# Altium footprint library Hydra_Ref_pcb.PcbLib: 353 footprints (part 9 of 23)
Each footprint in its own frame and in the unit in brackets; x right, y up, seen from the top. Pads: shape width x height; smd on the part's side, far side on the other; paste and mask are expansions set on the pad; w line width, h text height; cw(c..) or ccw(c..) is an arc to the next point about the centre after c.
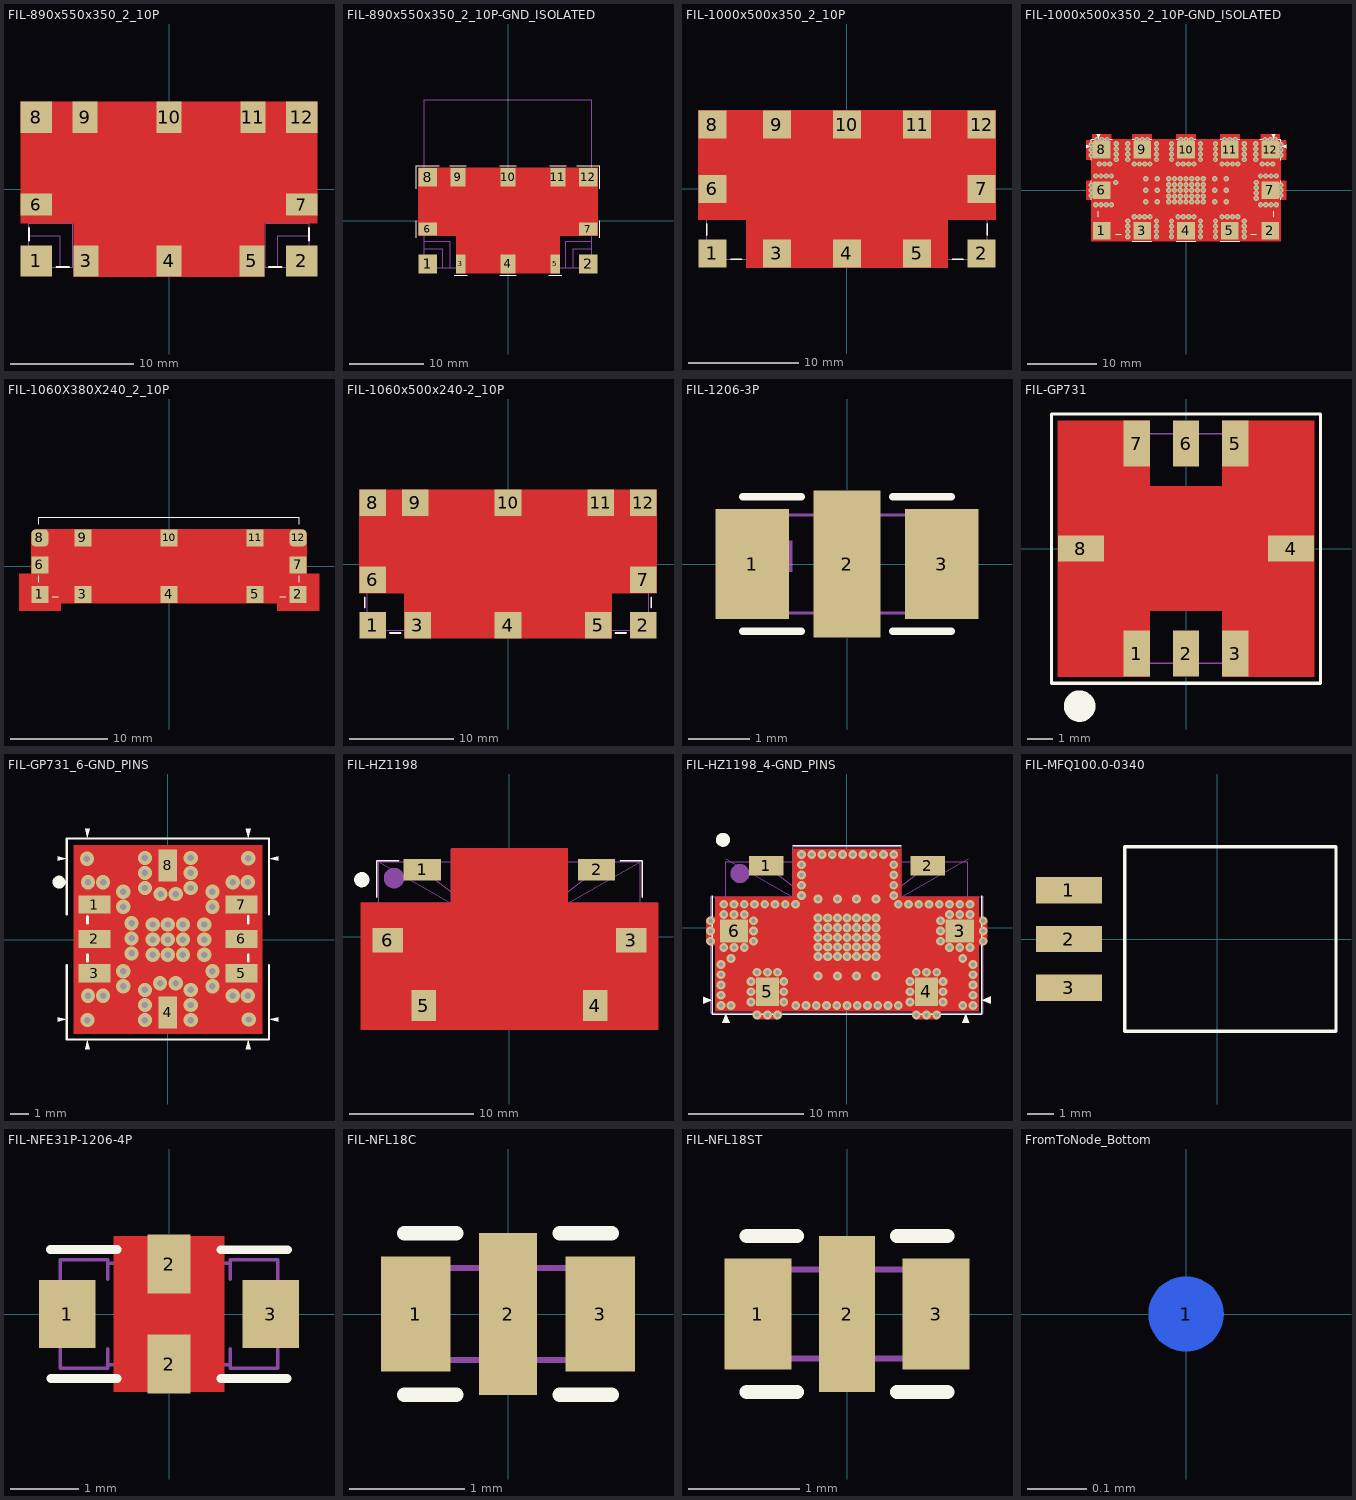
[diagram p8: the footprints below, top view; thin cyan lines are the x and y axes]

## FIL-890x550x350_2_10P [mil]
height 279.92
pads (12):
  rect 100x100 smd: 1(-425,-230) 2(425,-230) 8(-425,230) 12(425,230)
  rect 80x100 smd: 3(-265,-230) 4(0,-230) 5(265,-230) 9(-268.5,230) 10(0,230) 11(268.5,230)
  rect 100x70 smd: 6(-425,-50) 7(425,-50)
Top Layer:
  region: -475,-110 -305,-110 -305,-280 305,-280 305,-110 475,-110 475,280 -475,280
Top Overlay:
  lines w6: -448.5,-165 -448.5,-125 ; -360,-250 -320,-250 ; 320,-250 360,-250 ; 448.5,-165 448.5,-125
Top Paste:
  region: -475,-80 -275,-80 -275,-280 275,-280 275,-80 475,-80 475,280 -475,280
Top Solder:
  region: -480,-115 -310,-115 -310,-285 310,-285 310,-115 480,-115 480,285 -480,285
9 Top Assy:
  lines w2: -448.5,-219 cw(c-448.5,-250) -417.5,-250 ; -448.5,-150 -348.5,-150 -348.5,-250 ; -448.5,-110 -308.5,-110 -308.5,-250 ; -448.5,-81 ccw(c-448.5,-50) -448.5,-19 ; -448.5,-50 -435,-50 ; -448.5,219 ccw(c-448.5,250) -417.5,250 ; -299.5,-250 cw(c-268.5,-250) -237.5,-250 ; -299.5,250 ccw(c-268.5,250) -237.5,250 ; -268.5,-250 -268.5,-240 ; -268.5,240 -268.5,250 ; -31.1,-250 cw(c-0.1,-250) 30.9,-250 ; -30.9,250 ccw(c0.1,250) 31.1,250 ; 0,-250 0,-240 ; 237.5,-250 cw(c268.5,-250) 299.5,-250 ; 237.5,250 ccw(c268.5,250) 299.5,250 ; 268.5,-250 268.5,-240 ; 268.5,240 268.5,250 ; 308.5,-250 308.5,-110 448.5,-110 ; 348.5,-250 348.5,-150 448.5,-150 ; 417.5,-250 cw(c448.5,-250) 448.5,-219 ; 417.5,250 ccw(c448.5,250) 448.5,219 ; 435,-50 448.5,-50 ; 448.5,-81 cw(c448.5,-50) 448.5,-19 ; -5,240 -5,250 -5,240 ; -5,240 5,240 ; -5,240 5,240 ; 5,240 5,250 5,240 ; -448.5,-250 -448.5,250 448.5,250 448.5,-250 -448.5,-250
  text ".Designator" at -260,0 h80
3D body: height 350, standoff 0, extent -505,-300 500,310

## FIL-890x550x350_2_10P-GND_ISOLATED [mil] "All pins isolated with solder mask"
height 280
pads (12):
  rect 100x100 smd: 1(-425,-230) 2(425,-230) 8(-425,230) 12(425,230)
  rect 50x100 smd: 3(-250,-230) 5(250,-230)
  rect 80x100 smd: 4(0,-230) 9(-265,230) 10(0,230) 11(265,230)
  rect 100x70 smd: 6(-425,-45) 7(425,-45)
Top Layer:
  region: -475,-80 -275,-80 -275,-280 275,-280 275,-80 475,-80 475,280 -475,280
Top Overlay:
  lines w5: -485,-90 -485,0 ; -485,170 -485,290 -365,290 ; -310,290 -220,290 ; -285,-290 -215,-290 ; -45,-290 45,-290 ; -45,290 45,290 ; 215,-290 285,-290 ; 220,290 310,290 ; 365,290 485,290 485,170 ; 485,-90 485,0
Top Solder:
  region: 500,-295 -500,-295 -500,-305 500,-305
  region: 490,300 490,-300 500,-300 500,300
  region: 355,-95 355,-300 500,-300 500,-95
  rectangle: 290,-295 360,-150
  rectangle: -360,-300 -290,-155
  rectangle: -360,165 -320,300
  region: 500,305 -500,305 -500,295 500,295
  rectangle: 320,160 360,295
  region: -500,305 -500,-295 -490,-295 -490,305
  region: -490,-95 -490,-300 -345,-300 -345,-95
  rectangle: -210,-300 -55,-155
  rectangle: 55,-300 210,-155
  rectangle: -210,150 -55,295
  rectangle: 55,160 210,305
  region: -500,5 -360,5 -360,-165 360,-165 360,5 495,5 495,165 -500,165
9 Top Assy:
  lines w2: -445,-150 -345,-150 -345,-250 ; -445,-110 -305,-110 -305,-250 ; -445,-55 -435,-55 -435,-45 -445,-45 ; -445,240 -435,240 -435,250 435,250 435,240 445,240 ; -270,-250 -270,-240 -260,-240 -260,-250 ; -270,250 -270,240 -260,240 -260,250 ; -5,-250 -5,-240 5,-240 5,-250 ; 260,-250 260,-240 270,-240 270,-250 ; 260,250 260,240 270,240 270,250 ; 305,-250 305,-110 445,-110 ; 345,-250 345,-150 445,-150 ; 445,-55 435,-55 435,-45 445,-45 ; -5,240 -5,250 -5,240 ; -5,240 5,240 ; -5,240 5,240 ; 5,240 5,250 5,240 ; -445,-240 -435,-250 435,-250 445,-240 445,640 -445,640 -445,-240
  text ".Designator" at -140,-40 h80
3D body: height 280, standoff 0, extent -500,-305 500,305
3D body: height 280, standoff 60, extent -460,300 455,655

## FIL-1000x500x350_2_10P [mil]
height 350
pads (12):
  rect 100x100 smd: 1(-480,-230) 2(480,-230) 3(-250,-230) 4(0,-230) 5(250,-230) 6(-480,0) 7(480,0) 8(-480,230) 9(-250,230) 10(0,230) 11(250,230) 12(480,230)
Top Layer:
  region: -530,-110 -360,-110 -360,-280 360,-280 360,-110 530,-110 530,280 -530,280
Top Overlay:
  lines w6: -500,-165 -500,-125 ; -415,-250 -375,-250 ; 375,-250 415,-250 ; 500,-165 500,-125
Top Paste:
  region: -530,-110 -360,-110 -360,-280 360,-280 360,-110 530,-110 530,280 -530,280
Top Solder:
  region: -535,-115 -365,-115 -365,-285 365,-285 365,-115 535,-115 535,285 -535,285
9 Top Assy:
  lines w2: -500.03,219.02 ccw(c-499,250) -468,250 ; -500,-218 cw(c-500,-249) -469.02,-250.03 ; -500,-32 ccw(c-500,-1) -500,30 ; -282,-250 cw(c-251,-250) -220,-250 ; -280,250 ccw(c-249,250) -218,250 ; -32,-250 cw(c-1,-250) 30,-250 ; -30,250 ccw(c1,250) 32,250 ; 218,-250 cw(c249,-250) 280,-250 ; 220,250 ccw(c251,250) 282,250 ; 468,-250 cw(c499,-250) 500.03,-219.02 ; 469.02,250.03 ccw(c500,249) 500,218 ; 500,-32 cw(c500,-1) 500,30 ; -500,-250 500,-250 500,250 -500,250 -500,-250
  text ".Designator" at -330,-30 h80
3D body: height 350, standoff 0, extent -500,-250 500,250

## FIL-1000x500x350_2_10P-GND_ISOLATED [mil] "All pins isolated with solder mask"
height 350
pads (12):
  rect 100x100 smd: 1(-480,-230) 2(480,-230) 3(-250,-230) 4(0,-230) 5(250,-230) 6(-480,0) 7(480,0) 8(-480,230) 9(-250,230) 10(0,230) 11(250,230) 12(480,230)
via 510,290 diameter 30 hole 14
via 480,290 diameter 30 hole 14
via 450,290 diameter 30 hole 14
via 280,290 diameter 30 hole 14
via 250,290 diameter 30 hole 14
via 220,290 diameter 30 hole 14
via 30,290 diameter 30 hole 14
via 0,290 diameter 30 hole 14
via -30,290 diameter 30 hole 14
via -220,290 diameter 30 hole 14
via -250,290 diameter 30 hole 14
via -280,290 diameter 30 hole 14
via -450,290 diameter 30 hole 14
via -480,290 diameter 30 hole 14
via -510,290 diameter 30 hole 14
via 540,200 diameter 30 hole 14
via 540,230 diameter 30 hole 14
via 540,260 diameter 30 hole 14
via 540,-30 diameter 30 hole 14
via 540,0 diameter 30 hole 14
via 540,30 diameter 30 hole 14
via -540,260 diameter 30 hole 14
via -540,230 diameter 30 hole 14
via -540,200 diameter 30 hole 14
via 229.6,-65.6 diameter 31 hole 14
via 229.6,65.6 diameter 31 hole 14
via 229.6,0 diameter 31 hole 14
via 164,-65.6 diameter 31 hole 14
via 164,65.6 diameter 31 hole 14
via 164,0 diameter 31 hole 14
via -229.6,65.6 diameter 31 hole 14
via -229.6,-65.6 diameter 31 hole 14
via -229.6,0 diameter 31 hole 14
via -164,65.6 diameter 31 hole 14
via -164,-65.6 diameter 31 hole 14
via -164,0 diameter 31 hole 14
via -332,175 diameter 30 hole 14
via -332,205 diameter 30 hole 14
via -332,235 diameter 30 hole 14
via -332,265 diameter 30 hole 14
via -168,265 diameter 30 hole 14
via -168,235 diameter 30 hole 14
via -168,205 diameter 30 hole 14
via -168,175 diameter 30 hole 14
via -398,265 diameter 30 hole 14
via -398,235 diameter 30 hole 14
via -398,205 diameter 30 hole 14
via -398,175 diameter 30 hole 14
via 398,265 diameter 30 hole 14
via 398,235 diameter 30 hole 14
via 398,205 diameter 30 hole 14
via 398,175 diameter 30 hole 14
via 82,175 diameter 30 hole 14
via 82,205 diameter 30 hole 14
via 82,235 diameter 30 hole 14
via 82,265 diameter 30 hole 14
via -82,265 diameter 30 hole 14
via -82,235 diameter 30 hole 14
via -82,205 diameter 30 hole 14
via -82,175 diameter 30 hole 14
via 332,175 diameter 30 hole 14
via 332,205 diameter 30 hole 14
via 332,235 diameter 30 hole 14
via 332,265 diameter 30 hole 14
via 168,265 diameter 30 hole 14
via 168,235 diameter 30 hole 14
via 168,205 diameter 30 hole 14
via 168,175 diameter 30 hole 14
via 425,-82 diameter 30 hole 14
via 455,-82 diameter 30 hole 14
via 485,-82 diameter 30 hole 14
via 515,-82 diameter 30 hole 14
via 515,82 diameter 30 hole 14
via 485,82 diameter 30 hole 14
via 455,82 diameter 30 hole 14
via 425,82 diameter 30 hole 14
via 168,-175 diameter 30 hole 14
via 168,-205 diameter 30 hole 14
via 168,-235 diameter 30 hole 14
via 168,-265 diameter 30 hole 14
via 332,-265 diameter 30 hole 14
via 332,-235 diameter 30 hole 14
via 332,-205 diameter 30 hole 14
via 332,-175 diameter 30 hole 14
via -82,-175 diameter 30 hole 14
via -82,-205 diameter 30 hole 14
via -82,-235 diameter 30 hole 14
via -82,-265 diameter 30 hole 14
via 82,-265 diameter 30 hole 14
via 82,-235 diameter 30 hole 14
via 82,-205 diameter 30 hole 14
via 82,-175 diameter 30 hole 14
via -332,-175 diameter 30 hole 14
via -332,-205 diameter 30 hole 14
via -332,-235 diameter 30 hole 14
via -332,-265 diameter 30 hole 14
via -168,-265 diameter 30 hole 14
via -168,-235 diameter 30 hole 14
via -168,-205 diameter 30 hole 14
via -168,-175 diameter 30 hole 14
via -425,82 diameter 30 hole 14
via -455,82 diameter 30 hole 14
via -485,82 diameter 30 hole 14
via -515,82 diameter 30 hole 14
via -515,-82 diameter 30 hole 14
via -485,-82 diameter 30 hole 14
via -455,-82 diameter 30 hole 14
via -425,-82 diameter 30 hole 14
via -205,150 diameter 30 hole 14
via -235,150 diameter 30 hole 14
via -265,150 diameter 30 hole 14
via -295,150 diameter 30 hole 14
via -45,150 diameter 30 hole 14
via -15,150 diameter 30 hole 14
via 15,150 diameter 30 hole 14
via 45,150 diameter 30 hole 14
via 205,150 diameter 30 hole 14
via 235,150 diameter 30 hole 14
via 265,150 diameter 30 hole 14
via 295,150 diameter 30 hole 14
via 435,150 diameter 30 hole 14
via 465,150 diameter 30 hole 14
via 495,150 diameter 30 hole 14
via 400,45 diameter 30 hole 14
via 400,15 diameter 30 hole 14
via 400,-15 diameter 30 hole 14
via 400,-45 diameter 30 hole 14
via 295,-150 diameter 30 hole 14
via 265,-150 diameter 30 hole 14
via 235,-150 diameter 30 hole 14
via 205,-150 diameter 30 hole 14
via 45,-150 diameter 30 hole 14
via 15,-150 diameter 30 hole 14
via -15,-150 diameter 30 hole 14
via -45,-150 diameter 30 hole 14
via -205,-150 diameter 30 hole 14
via -235,-150 diameter 30 hole 14
via -265,-150 diameter 30 hole 14
via -295,-150 diameter 30 hole 14
via -540,-30 diameter 30 hole 14
via -540,0 diameter 30 hole 14
via -540,30 diameter 30 hole 14
via -400,45 diameter 30 hole 14
via -495,150 diameter 30 hole 14
via -465,150 diameter 30 hole 14
via -435,150 diameter 30 hole 14
via 98.4,65.6 diameter 31 hole 14
via 98.4,32.8 diameter 31 hole 14
via 98.4,0 diameter 31 hole 14
via 98.4,-32.8 diameter 31 hole 14
via 98.4,-65.6 diameter 31 hole 14
via 65.6,65.6 diameter 31 hole 14
via 65.6,32.8 diameter 31 hole 14
via 65.6,0 diameter 31 hole 14
via 65.6,-32.8 diameter 31 hole 14
via 65.6,-65.6 diameter 31 hole 14
via -65.6,-65.6 diameter 31 hole 14
via -32.8,-65.6 diameter 31 hole 14
via 0,-65.6 diameter 31 hole 14
via 32.8,-65.6 diameter 31 hole 14
via -65.6,-32.8 diameter 31 hole 14
via -32.8,-32.8 diameter 31 hole 14
via 0,-32.8 diameter 31 hole 14
via 32.8,-32.8 diameter 31 hole 14
via -65.6,0 diameter 31 hole 14
via -32.8,0 diameter 31 hole 14
via 0,0 diameter 31 hole 14
via 32.8,0 diameter 31 hole 14
via -65.6,32.8 diameter 31 hole 14
via -32.8,32.8 diameter 31 hole 14
via 0,32.8 diameter 31 hole 14
via 32.8,32.8 diameter 31 hole 14
via -98.4,32.8 diameter 31 hole 14
via -98.4,0 diameter 31 hole 14
via -98.4,-32.8 diameter 31 hole 14
via -98.4,-65.6 diameter 31 hole 14
via 32.8,65.6 diameter 31 hole 14
via 0,65.6 diameter 31 hole 14
via -32.8,65.6 diameter 31 hole 14
via -65.6,65.6 diameter 31 hole 14
via -98.4,65.6 diameter 31 hole 14
Top Layer:
  region: 435,290 435,230 525,230 525,290
  region: 450,305 450,230 510,230 510,305
  region: 205,290 205,230 295,230 295,290
  region: 220,305 220,230 280,230 280,305
  region: -45,290 -45,230 45,230 45,290
  region: -30,305 -30,230 30,230 30,305
  region: -295,290 -295,230 -205,230 -205,290
  region: -280,305 -280,230 -220,230 -220,305
  region: -525,290 -525,230 -435,230 -435,290
  region: -510,305 -510,230 -450,230 -450,305
  region: 540,275 480,275 480,185 540,185
  region: 555,260 480,260 480,200 555,200
  region: 540,45 480,45 480,-45 540,-45
  region: 555,30 480,30 480,-30 555,-30
  rectangle: -540,185 -480,275
  rectangle: -555,200 -480,260
  rectangle: -555,-30 -480,30
  rectangle: -540,-45 -480,45
  pour cut-out: 535,290 535,320 425,320 425,290
  pour cut-out: 305,290 305,320 195,320 195,290
  pour cut-out: 55,290 55,320 -55,320 -55,290
  pour cut-out: -195,290 -195,320 -305,320 -305,290
  pour cut-out: -425,290 -425,320 -535,320 -535,290
  pour cut-out: 540,175 570,175 570,285 540,285
  pour cut-out: 540,-55 570,-55 570,55 540,55
  pour cut-out: -540,285 -570,285 -570,175 -540,175
  pour cut-out: -540,55 -570,55 -570,-55 -540,-55
  region: -530,-110 -360,-110 -360,-280 360,-280 360,-110 530,-110 530,280 -530,280
  pour cut-out: -540,290 540,290 540,-290 -540,-290
Top Overlay:
  region: 490,320 500,290 510,320
  region: 570,260 540,250 570,240
  region: -570,240 -540,250 -570,260
  region: -510,320 -500,290 -490,320
  lines w5: -540,-55 -540,55 ; -540,170 -540,290 -420,290 ; -540,175 -540,285 ; -535,290 -425,290 ; -500,-150 -500,-120 ; -400,-250 -370,-250 ; -305,-290 -195,-290 ; -55,-290 55,-290 ; 195,-290 305,-290 ; 370,-250 400,-250 ; 420,290 540,290 540,170 ; 425,290 535,290 ; 500,-150 500,-120 ; 540,175 540,285 ; -305,290 -195,290 -305,290 ; -55,290 55,290 -55,290 ; 195,290 305,290 195,290 ; 540,-55 540,55 540,-55
Top Solder:
  region: 555,-295 -500,-295 -500,-305 555,-305
  region: 545,305 545,-305 555,-305 555,305
  region: 555,305 -555,305 -555,295 555,295
  region: -555,-65 -555,-305 -315,-305 -315,-65
  region: 315,-65 315,-295 555,-295 555,-65
  region: -555,305 -555,-305 -545,-305 -545,305
  region: -185,-155 -185,-305 -65,-305 -65,-155
  region: 65,-150 65,-300 185,-300 185,-150
  region: -185,300 -185,150 -65,150 -65,300
  region: 65,305 65,155 185,155 185,305
  region: 315,300 315,150 415,150 415,300
  region: -415,295 -415,145 -315,145 -315,295
  region: -555,65 -415,65 -415,-165 415,-165 415,65 550,65 550,165 -555,165
9 Top Assy:
  lines w2: -500,-219 cw(c-500,-250) -469,-250 ; -500,-31 ccw(c-500,0) -500,31 ; -500,219 ccw(c-500,250) -469,250 ; -281,-250 cw(c-250,-250) -219,-250 ; -281,250 ccw(c-250,250) -219,250 ; -31,-250 cw(c0,-250) 31,-250 ; -31,250 ccw(c0,250) 31,250 ; 219,-250 cw(c250,-250) 281,-250 ; 219,245 ccw(c250,245) 281,245 ; 469,-250 cw(c500,-250) 500,-219 ; 469,250 ccw(c500,250) 500,219 ; 500,-31 cw(c500,0) 500,31 ; -500,-250 -500,250 500,250 500,-250 -500,-250
  text ".Designator" at -135,-35 h80
3D body: height 350, standoff 0, extent -550,-300 550,300

## FIL-1060X380X240_2_10P [mil] "Lark part # 4SD3600-U200-6CC"
height 240
pads (12):
  rect 70x70 smd: 1(-525,-115) 2(525,-115) 3(-350,-115) 4(0,-115) 5(350,-115) 6(-525,5) 7(525,5) 9(-350,115) 10(0,115) 11(350,115)
  rrect50% 70x70 smd: 8(-525,115) 12(525,115)
Top Layer:
  pour cut-out: 610,-30 440,-30 440,-181 610,-181
  pour cut-out: -610,-30 -440,-30 -440,-181 -610,-181
  region: -560,-30 -440,-30 -440,-150 440,-150 440,-30 560,-30 560,134 541,150 -542,150 -560,133
Top Overlay:
  lines w5: -530,-65 -530,-40 ; -530,170 -530,198.5 530,198.5 530,170 ; -475,-125 -450,-125 ; 450,-125 475,-125 ; 530,-65 530,-40
Top Paste:
  region: -560,150 560,150 560,-30 440,-30 440,-150 -440,-150 -440,-30 -560,-30
Top Solder:
  region: 568,-81 440,-81 440,-181 568,-181
  rectangle: -568,-181 -440,-81
  region: -568,158 568,158 568,-158 -568,-158
Bottom Solder:
  rectangle: -309.5,-80.5 310,81.5
9 Top Assy:
  lines w2: -530,-85 -490,-85 -490,-125 ; -530,-15 -490,-15 -490,30 -530,30 ; -530,85 -490,85 -490,125 -530,125 ; -375,-125 -375,-85 -325,-85 -325,-125 ; -25,-125 -25,-85 25,-85 25,-125 ; 325,-125 325,-85 375,-85 375,-125 ; 490,125 490,85 530,85 530,125 ; 528.5,-125 -530,-125 -530,125 ; 530,-15 490,-15 490,30 530,30 ; -530,125 530,125 ; 530,-125 490,-125 490,-85 530,-85 530,-125 ; 530,-125 530,125 ; -375,85 -325,85 -325,125 -375,125 -375,85 ; -25,85 25,85 25,125 -25,125 -25,85 ; 325,85 325,125 375,125 375,85 325,85
  text ".Designator" at -230,-15 h50
3D body: height 240, standoff 0, extent -530,-125 530,255

## FIL-1060x500x240-2_10P [mil]
height 240
pads (12):
  rect 100x100 smd: 1(-510,-230) 2(510,-230) 3(-340,-230) 4(0,-230) 5(340,-230) 6(-510,-60) 7(510,-60) 8(-510,230) 9(-350,230) 10(0,230) 11(350,230) 12(510,230)
Top Layer:
  region: -560,-110 -390,-110 -390,-280 390,-280 390,-110 560,-110 560,280 -560,280
Top Overlay:
  lines w6: -540,-165 -540,-125 ; -445,-260 -405,-260 ; 405,-260 445,-260 ; 540,-165 540,-125
Top Paste:
  region: -560,-110 -390,-110 -390,-280 390,-280 390,-110 560,-110 560,280 -560,280
Top Solder:
  region: -565,-115 -395,-115 -395,-285 395,-285 395,-115 565,-115 565,285 -565,285
9 Top Assy:
  lines w2: -530,-85 -490,-85 -490,-35 -530,-35 ; -530,208.5 -490,208.5 -490,248.5 ; -528.5,-210 -488.5,-210 -488.5,-250 ; -375,250 -375,210 -325,210 -325,250 ; -365,-250 -365,-210 -315,-210 -315,-250 ; -25,-250 -25,-210 25,-210 25,-250 ; -25,250 -25,210 25,210 25,250 ; 315,-250 315,-210 365,-210 365,-250 ; 325,250 325,210 375,210 375,250 ; 490,-248.5 490,-208.5 530,-208.5 ; 528.5,250 -530,250 -530,-250 530,-250 530,250 ; 530,-80 488.5,-80 488.5,-30 530,-30
  text ".Designator" at -110,-35 h80
3D body: height 240, standoff 0, extent -530,-250 530,250

## FIL-1206-3P [mm] "0603 series NFL18ST"
height 1.8
pads (3):
  rect 1.2x1.8 smd: 1(-1.55,0) 3(1.55,0)
  rect 1.1x2.4 smd: 2(0,0)
Top Overlay:
  lines w0.127: -1.7,-1.1 -0.75,-1.1 ; -1.7,1.1 -0.75,1.1 ; 0.75,-1.1 1.7,-1.1 ; 0.75,1.1 1.7,1.1
9 Top Assy:
  rectangle: -1.4,-0.127 -0.889,0.381
  lines w0.051: -1.7,-0.8 -1.7,0.8 1.6,0.8 1.6,-0.8 -1.7,-0.8
  text ".Designator" at -1.4,-0.4 h0.8
3D body: height 1.8, standoff 0.01, extent -2.35,-1.397 2.35,1.397

## FIL-GP731 [mil] "CASE STYLE GP731 -Mini-Circuit"
height 110
pads (8):
  rect 40x70 smd mask+3: 1(-75,-160) 2(0,-160) 3(75,-160) 5(75,160) 6(0,160) 7(-75,160)
  rect 70x40 smd mask+3: 4(160,0) 8(-160,0)
Top Layer:
  region: -55,-195 -55,-95 55,-95 55,-195 195,-195 195,195 55,195 55,95 -55,95 -55,195 -195,195 -195,-195
Top Overlay:
  circle w24: c-162,-240 r12
  lines w5: -205,-205 205,-205 205,205 -205,205 -205,-205
Top Paste:
  region: -55,-195 -55,-95 55,-95 55,-195 195,-195 195,195 55,195 55,95 -55,95 -55,195 -195,195 -195,-195
Top Solder:
  region: -50,-200 -50,-100 50,-100 50,-200 200,-200 200,200 50,200 50,100 -50,100 -50,200 -200,200 -200,-200
9 Top Assy:
  circle w30: c-135,-135 r15
  lines w2: -175,-175 175,-175 175,175 -175,175 -175,-175
  text ".Designator" at -140,-35 h65
3D body: height 110, standoff 0, extent -225,-225 225,225

## FIL-GP731_6-GND_PINS [mil] "CASE STYLE GP731 -Mini-Circuit, All pins isolated with solder mask"
height 110
pads (8):
  rect 70x40 smd mask+3: 1(-160,76.31) 2(-160,1.31) 3(-160,-73.69) 5(160,-73.69) 6(160,1.31) 7(160,76.31)
  rect 40x70 smd mask+3: 4(0,-158.69) 8(0,161.31)
via 17,-95 diameter 31 hole 14
via -16.99,-95 diameter 31 hole 14
via 17,99 diameter 31 hole 14
via -15.8,99 diameter 31 hole 14
via -49.99,-109.59 diameter 31 hole 14
via -49.99,-142.39 diameter 31 hole 14
via -49.99,-175.19 diameter 31 hole 14
via 50,-109.59 diameter 31 hole 14
via 50,-142.39 diameter 31 hole 14
via 50,-175.19 diameter 31 hole 14
via -49.99,112.2 diameter 31 hole 14
via -49.99,145 diameter 31 hole 14
via -49.99,177.8 diameter 31 hole 14
via 50,177.8 diameter 31 hole 14
via 50,145 diameter 31 hole 14
via 50,112.2 diameter 31 hole 14
via -97,-68.89 diameter 31 hole 14
via -97,-101.69 diameter 31 hole 14
via -173.8,-122.39 diameter 31 hole 14
via -141,-122.39 diameter 31 hole 14
via 97.01,-68.89 diameter 31 hole 14
via 97.01,-101.69 diameter 31 hole 14
via 173.81,-122.39 diameter 31 hole 14
via 141.01,-122.39 diameter 31 hole 14
via 97.01,71.5 diameter 31 hole 14
via 97.01,104.3 diameter 31 hole 14
via 173.81,125 diameter 31 hole 14
via 141.01,125 diameter 31 hole 14
via -141,125 diameter 31 hole 14
via -173.8,125 diameter 31 hole 14
via -97,104.3 diameter 31 hole 14
via -97,71.5 diameter 31 hole 14
via -78.99,35.41 diameter 31 hole 14
via -78.99,2.61 diameter 31 hole 14
via -78.99,-30.19 diameter 31 hole 14
via 79,32.8 diameter 31 hole 14
via 79,0 diameter 31 hole 14
via 79,-32.8 diameter 31 hole 14
via 0,-32.8 diameter 31 hole 14
via 32.8,-32.8 diameter 31 hole 14
via 0,0 diameter 31 hole 14
via 32.8,0 diameter 31 hole 14
via 0,32.8 diameter 31 hole 14
via 32.8,32.8 diameter 31 hole 14
via -32.8,32.8 diameter 31 hole 14
via -32.8,0 diameter 31 hole 14
via -32.8,-32.8 diameter 31 hole 14
via -175,-175.19 diameter 31 hole 14
via 176.19,-174 diameter 31 hole 14
via 175,177.19 diameter 31 hole 14
via -176.19,176 diameter 31 hole 14
Top Layer:
  region: -195,56 -95,56 -95,-52.48 -195,-52.48 -195,-194 195,-194 195,-54 95,-54 95,56 195,56 195,196 -195,196
  pour cut-out: -205,205 205,205 205,-205 -205,-205
Top Overlay:
  circle w14: c-237,125 r7
  region: -240,181.31 -240,171.31 -220,176.31
  region: -170,241.31 -180,241.31 -175,221.31
  region: 240,171.31 240,181.31 220.01,176.31
  region: 180,241.31 170,241.31 175,221.31
  region: 240,-178.69 240,-168.69 220.01,-173.69
  region: 170,-238.69 180,-238.69 175,-218.7
  region: -180,-238.69 -170,-238.69 -175,-218.7
  region: -240,-168.69 -240,-178.69 -220,-173.69
  lines w5: -220,-55.22 -220,-217.5 220,-217.5 220,-55.22 ; -220,55 -220,220 220,220 220,55
  lines w6: -175,-47.39 -175,-32.8 ; -175,35.41 -175,50 ; 175,-47.39 175,-32.8 ; 175,35.41 175,50
Top Solder:
  region: 33,215 33,110 215,110 215,215
  region: -33,109 -33,215 -215,215 -215,109
  rectangle: -44,209 43.69,215
  region: 32,-106 32,-213 215,-213 215,-106
  region: 44,-207 -43.69,-207 -43.69,-213 44,-213
  region: -33,-213 -33,-106 -215,-106 -215,-213
  region: -208,-110 -208,115 -215,115 -215,-110
  region: 210,-25 -210,-25 -210,-41 210,-41
  rectangle: -215,27.5 210,43
  region: 208,118 208,-117 215,-117 215,118
  region: -200,-40 200,-40 200,40 -200,40
  region: -112.5,-111 112.5,-111 112.5,115 -112.5,115
9 Top Assy:
  circle w30: c-135,136.31 r15
  lines w2: -175,-173.69 -175,176.31 175,176.31 175,-173.69 -175,-173.69
  text ".Designator" at -115,-34.68 h65
3D body: height 110, standoff 0, extent -225,-223.69 225,226.31

## FIL-HZ1198 [mm] "CASE STYLE HZ1198 -Mini-Circuit"
height 5.6
pads (6):
  rect 3x1.7 smd mask+0.076: 1(-7,5.368) 2(7,5.368)
  rect 2.44x1.98 smd mask+0.076: 3(9.78,-0.282) 6(-9.78,-0.282)
  rect 1.98x2.49 smd mask+0.076: 4(6.895,-5.537) 5(-6.895,-5.537)
Top Layer:
  region: 11.938,2.705 4.699,2.705 4.699,7.112 -4.686,7.112 -4.686,2.705 -11.938,2.705 -11.938,-7.493 11.938,-7.493
Top Overlay:
  circle w0.61: c-11.862,4.572 r0.305
  lines w0.127: -10.668,3.175 -10.668,6.096 -8.89,6.096 ; 8.89,6.096 10.668,6.096 10.668,3.175
Top Paste:
  region: 11.049,2.705 4.699,2.705 4.699,6.223 -4.686,6.223 -4.686,2.705 -11.049,2.705 -11.049,-6.858 11.049,-6.858
Top Solder:
  region: 11.176,2.794 4.775,2.794 4.775,6.35 -4.775,6.35 -4.775,2.794 -11.176,2.794 -11.176,-6.985 11.176,-6.985
9 Top Assy:
  circle w0.889: c-9.271,4.699 r0.381
  lines w0.051: -10.5,-6 10.5,-6 10.5,6 -10.5,6 -10.5,-6
  text ".Designator" at -6.604,-0.889 h1.65
22 Part Dimentions & Info:
  lines w0.01: -10.5,-6 10.5,6 ; -10.5,6 10.5,-6 ; -7,5.368 6.895,-5.287 ; -6.895,-5.287 7,5.368
  lines w0.025: 11.811,2.705 11.811,-7.353 -11.811,-7.353 -11.811,2.705 -4.686,2.705 -4.686,7.036 4.699,7.036 4.699,2.705 11.836,2.705
3D body: height 2.79, standoff 0, extent -11.81,-7.366 11.705,7.298

## FIL-HZ1198_4-GND_PINS [mil] "CASE STYLE HZ1198 -Mini-Circuit, All GND pins isolated with solder mask"
height 230
pads (6):
  rect 118x67 smd mask+3: 1(-275.59,211.33) 2(275.59,211.33)
  rect 96x78 smd mask+3: 3(385.04,-11.11) 6(-385.04,-11.11)
  rect 78x98 smd mask+3: 4(271.46,-217.99) 5(-271.46,-217.99)
via 98.65,98.4 diameter 31 hole 14
via -32.55,98.4 diameter 31 hole 14
via 33.05,98.4 diameter 31 hole 14
via -98.15,98.4 diameter 31 hole 14
via -98.15,-164 diameter 31 hole 14
via 33.05,-164 diameter 31 hole 14
via -32.55,-164 diameter 31 hole 14
via 98.65,-164 diameter 31 hole 14
via 98.65,32.8 diameter 31 hole 14
via 98.65,0 diameter 31 hole 14
via 98.65,-32.8 diameter 31 hole 14
via 98.65,-65.6 diameter 31 hole 14
via 98.65,-98.4 diameter 31 hole 14
via 65.85,32.8 diameter 31 hole 14
via 65.85,0 diameter 31 hole 14
via 65.85,-32.8 diameter 31 hole 14
via 65.85,-65.6 diameter 31 hole 14
via 65.85,-98.4 diameter 31 hole 14
via -65.35,-98.4 diameter 31 hole 14
via -32.55,-98.4 diameter 31 hole 14
via 0.25,-98.4 diameter 31 hole 14
via 33.05,-98.4 diameter 31 hole 14
via -65.35,-65.6 diameter 31 hole 14
via -32.55,-65.6 diameter 31 hole 14
via 0.25,-65.6 diameter 31 hole 14
via 33.05,-65.6 diameter 31 hole 14
via -65.35,-32.8 diameter 31 hole 14
via -32.55,-32.8 diameter 31 hole 14
via 0.25,-32.8 diameter 31 hole 14
via 33.05,-32.8 diameter 31 hole 14
via -65.35,0 diameter 31 hole 14
via -32.55,0 diameter 31 hole 14
via 0.25,0 diameter 31 hole 14
via 33.05,0 diameter 31 hole 14
via -98.15,0 diameter 31 hole 14
via -98.15,-32.8 diameter 31 hole 14
via -98.15,-65.6 diameter 31 hole 14
via -98.15,-98.4 diameter 31 hole 14
via 33.05,32.8 diameter 31 hole 14
via 0.25,32.8 diameter 31 hole 14
via -32.55,32.8 diameter 31 hole 14
via -65.35,32.8 diameter 31 hole 14
via -98.15,32.8 diameter 31 hole 14
via 430,-230.04 diameter 30 hole 14
via 430,-265 diameter 30 hole 14
via 430,-195.08 diameter 30 hole 14
via 430,-160.12 diameter 30 hole 14
via 430,-125.16 diameter 30 hole 14
via 395.04,-265 diameter 30 hole 14
via 395.04,-105 diameter 30 hole 14
via 175,-265 diameter 30 hole 14
via 140.04,-265 diameter 30 hole 14
via 105.08,-265 diameter 30 hole 14
via 70.12,-265 diameter 30 hole 14
via 35.16,-265 diameter 30 hole 14
via 0.2,-265 diameter 30 hole 14
via -34.76,-265 diameter 30 hole 14
via -69.72,-265 diameter 30 hole 14
via -104.68,-265 diameter 30 hole 14
via -139.65,-265 diameter 30 hole 14
via -174.61,-265 diameter 30 hole 14
via 420.08,79.96 diameter 30 hole 14
via 385.12,79.96 diameter 30 hole 14
via 350.16,79.96 diameter 30 hole 14
via 315.2,79.96 diameter 30 hole 14
via 280.24,79.96 diameter 30 hole 14
via 245.28,79.96 diameter 30 hole 14
via 210.32,79.96 diameter 30 hole 14
via 175.35,79.96 diameter 30 hole 14
via 159.65,110 diameter 30 hole 14
via 159.65,144.96 diameter 30 hole 14
via 159.65,179.92 diameter 30 hole 14
via 159.65,214.88 diameter 30 hole 14
via 159.65,249.84 diameter 30 hole 14
via 124.68,249.84 diameter 30 hole 14
via 89.72,249.84 diameter 30 hole 14
via 54.76,249.84 diameter 30 hole 14
via 19.8,249.84 diameter 30 hole 14
via -15.16,249.84 diameter 30 hole 14
via -50.12,249.84 diameter 30 hole 14
via -85.08,249.84 diameter 30 hole 14
via -120.04,249.84 diameter 30 hole 14
via -155,249.84 diameter 30 hole 14
via -155,214.88 diameter 30 hole 14
via -155,179.92 diameter 30 hole 14
via -155,144.96 diameter 30 hole 14
via -155,110 diameter 30 hole 14
via -175.28,79.96 diameter 30 hole 14
via -210.24,79.96 diameter 30 hole 14
via -245.2,79.96 diameter 30 hole 14
via -280.16,79.96 diameter 30 hole 14
via -315.12,79.96 diameter 30 hole 14
via -350.08,79.96 diameter 30 hole 14
via -385.04,79.96 diameter 30 hole 14
via -420,79.96 diameter 30 hole 14
via -395.04,-105 diameter 30 hole 14
via -395.04,-265 diameter 30 hole 14
via -430,-125.16 diameter 30 hole 14
via -430,-160.12 diameter 30 hole 14
via -430,-195.08 diameter 30 hole 14
via -430,-265 diameter 30 hole 14
via -430,-230.04 diameter 30 hole 14
via 350,-67.22 diameter 30 hole 14
via 385.04,-67.22 diameter 30 hole 14
via 420,-67.22 diameter 30 hole 14
via 350.08,45 diameter 30 hole 14
via 385.04,45 diameter 30 hole 14
via 420.08,45 diameter 30 hole 14
via 318.89,-46.07 diameter 30 hole 14
via 318.89,-11.11 diameter 30 hole 14
via 318.89,23.93 diameter 30 hole 14
via 465,23.85 diameter 30 hole 14
via 465,-11.11 diameter 30 hole 14
via 465,-46.15 diameter 30 hole 14
via 215.34,-182.95 diameter 30 hole 14
via 215.34,-217.99 diameter 30 hole 14
via 215.34,-252.95 diameter 30 hole 14
via 327.57,-183.03 diameter 30 hole 14
via 327.57,-217.99 diameter 30 hole 14
via 327.57,-253.03 diameter 30 hole 14
via 236.5,-151.84 diameter 30 hole 14
via 271.46,-151.84 diameter 30 hole 14
via 306.5,-151.84 diameter 30 hole 14
via 306.42,-297.95 diameter 30 hole 14
via 271.46,-297.95 diameter 30 hole 14
via 236.42,-297.95 diameter 30 hole 14
via -327.57,-182.95 diameter 30 hole 14
via -327.57,-217.99 diameter 30 hole 14
via -327.57,-252.95 diameter 30 hole 14
via -215.34,-183.03 diameter 30 hole 14
via -215.34,-217.99 diameter 30 hole 14
via -215.34,-253.03 diameter 30 hole 14
via -306.42,-151.84 diameter 30 hole 14
via -271.46,-151.84 diameter 30 hole 14
via -236.42,-151.84 diameter 30 hole 14
via -236.5,-297.95 diameter 30 hole 14
via -271.46,-297.95 diameter 30 hole 14
via -306.5,-297.95 diameter 30 hole 14
via -465,23.93 diameter 30 hole 14
via -465,-11.11 diameter 30 hole 14
via -465,-46.07 diameter 30 hole 14
via -318.89,-46.15 diameter 30 hole 14
via -318.89,-11.11 diameter 30 hole 14
via -318.89,23.85 diameter 30 hole 14
via -420.08,-67.22 diameter 30 hole 14
via -385.04,-67.22 diameter 30 hole 14
via -350.08,-67.22 diameter 30 hole 14
via -420,45 diameter 30 hole 14
via -385.04,45 diameter 30 hole 14
via -350,45 diameter 30 hole 14
Top Layer:
  region: 465,38.78 385.04,38.78 385.04,-61.22 465,-61.22
  region: 480,23.85 385.04,23.85 385.04,-46.22 480,-46.22
  region: 321.34,-297.95 321.34,-217.99 221.34,-217.99 221.34,-297.95
  region: 306.42,-312.95 306.42,-217.99 236.34,-217.99 236.34,-312.95
  region: -221.57,-297.95 -221.57,-217.99 -321.57,-217.99 -321.57,-297.95
  region: -236.5,-312.95 -236.5,-217.99 -306.57,-217.99 -306.57,-312.95
  rectangle: -480,-46.07 -385.04,24
  rectangle: -465,-61 -385.04,39
  region: 450,106.5 185,106.5 185,270 -184.5,270 -184.5,106.5 -450,106.5 -450,-285 450,-285
Top Overlay:
  circle w24: c-423,300 r12
  region: 393,-324 418,-324 405,-294
  region: -425,-324 -400,-324 -413,-294
  region: 490,-259 490,-234 460,-247
  region: -490,-235 -490,-260 -460,-247
  lines w5: -460,110 -460,-295 460,-295 460,110 ; -185,280 185,280
Top Solder:
  region: -219.57,-146.95 -219.57,-288.95 219,-288.95 219,-146.95
  region: 333,-280 -330,-280 -330,-290 333,-290
  region: -445,-73 -445,50 -455,50 -455,-73
  region: 455,40 455,280 180,280 180,40
  region: -170,156 -170,280 -455,280 -455,156
  region: -314,41 -314,165 -455,165 -455,41
  region: -455,-63 -455,-157 -314,-157 -314,-63
  region: -325,-290 -325,-147 -455,-147 -455,-290
  region: 324,-63 324,-290 455,-290 455,-63
  region: 446,49.78 446,-73.22 455,-73.22 455,49.78
  region: 324,165 203,165 203,280 -204,280 -204,165 -324,165 -324,-157 324,-157
9 Top Assy:
  circle w35: c-365,185 r15
  lines w2: -413,-247 -413,225 413,225 413,-247 -413,-247
  text ".Designator" at -110,-25 h65
16 Title Block:
  lines w0.39: -413.39,-236.22 413.39,236.22 ; -413.39,236.22 413.39,-236.22 ; -275.59,211.33 271.46,-208.16 ; -271.46,-208.16 275.59,211.33
  lines w1: 465,106.5 465,-289.5 -465,-289.5 -465,106.5 -184.5,106.5 -184.5,277 185,277 185,106.5 466,106.5
3D body: height 230, standoff 0, extent -462.89,-297.32 462.89,290

## FIL-MFQ100.0-0340 [mil] "TH, leads cut and bent and mounted as SM part, Comb Generator"
height 129.92
pads (3):
  rect 100x40 smd: 1(-225,74) 2(-225,0) 3(-225,-74)
Top Overlay:
  lines w5: -140.31,-140 179.69,-140 179.69,140 -140.31,140 -140.31,-140
9 Top Assy:
  lines w2: -140.31,-140 -140.31,140 179.69,140 179.69,-140 -140.31,-140
  text ".Designator" at -75,-25 h60
3D body: height 125.98, standoff 0, extent -285,-157.48 196.85,157.48

## FIL-NFE31P-1206-4P [mil] "Chip EMIFIL LC Combined Type NFE31P(1206 Size), 3.2mmX1.6mmX1.6mm"
height 68.9
pads (4):
  rect 33x39.37 smd: 1(-59,0) 3(59,0)
  rect 25x34 smd: 2(0,-29) 2(0,29)
Top Layer:
  pour cut-out: -32,45 32,45 32,-45 -32,-45
Top Overlay:
  lines w5: -68.81,37.4 -30,37.4 ; -68.52,-37.4 -30,-37.4 ; 30,-37.4 68.62,-37.4 ; 30,37.18 68.9,37.18
Top Solder:
  pour cut-out: -87,27 -87,-27 -57,-57 57,-57 87,-27 87,27 57,57 -57,57
9 Top Assy:
  lines w2: -35.43,-29.53 -19.68,-29.53 ; -35.43,-20 -35.43,-31.5 -62.99,-31.5 -62.99,31.5 -35.43,31.5 -35.43,20 ; -35.43,29.53 -19.68,29.53 ; -19.69,-20 -19.69,-31.5 19.68,-31.5 19.68,-20 ; -19.69,20 -19.69,31.5 19.68,31.5 19.68,20 ; 19.69,-29.53 35.43,-29.53 ; 19.69,29.53 35.43,29.53 ; 35.43,-20 35.43,-31.5 62.99,-31.5 62.99,31.5 35.43,31.5 35.43,20
  text ".Designator" at -29,-6 h15
3D body: height 68.9, standoff 0, extent -62.97,-31.48 62.97,31.48

## FIL-NFL18C [mm] "0603 series NFL18C"
height 1.778
pads (3):
  rect 0.6x1 smd mask+0.076: 1(-0.8,0) 3(0.8,0)
  rect 0.5x1.4 smd mask+0.076: 2(0,0)
Top Overlay:
  lines w0.127: -0.9,-0.7 -0.45,-0.7 ; -0.9,0.7 -0.45,0.7 ; 0.45,-0.7 0.9,-0.7 ; 0.45,0.7 0.9,0.7
9 Top Assy:
  lines w0.051: -0.85,-0.4 0.85,-0.4 0.85,0.4 -0.85,0.4 -0.85,-0.4
  text ".Designator" at -0.762,-0.203 h0.43
3D body: height 0.7, standoff 0, extent -0.851,-0.45 0.851,0.45

## FIL-NFL18ST [mm] "0603 series NFL18ST"
height 1.905
pads (3):
  rect 0.6x1 smd mask+0.064: 1(-0.8,0) 3(0.8,0)
  rect 0.5x1.4 smd mask+0.064: 2(0,0)
Top Overlay:
  lines w0.127: -0.9,-0.7 -0.45,-0.7 ; -0.9,0.7 -0.45,0.7 ; 0.45,-0.7 0.9,-0.7 ; 0.45,0.7 0.9,0.7
Top Solder:
  pour cut-out: -1.346,0.94 1.346,0.94 1.346,-0.94 -1.346,-0.94
9 Top Assy:
  lines w0.051: -0.85,-0.4 -0.85,0.4 0.85,0.4 0.85,-0.4 -0.85,-0.4
  text ".Designator" at -0.533,-0.102 h0.3
3D body: height 1.91, standoff 0, extent -0.849,-0.399 0.849,0.399

## FromToNode_Bottom [mil]
pads (1):
  round 5 smd far side paste-5 mask-5: 1(0,0)